# Altium footprint library AltiumLibrary.PcbLib: 107 footprints (part 5 of 7)
Each footprint in its own frame and in the unit in brackets; x right, y up, seen from the top. Pads: shape width x height; smd on the part's side, far side on the other; paste and mask are expansions set on the pad; w line width, h text height; cw(c..) or ccw(c..) is an arc to the next point about the centre after c.
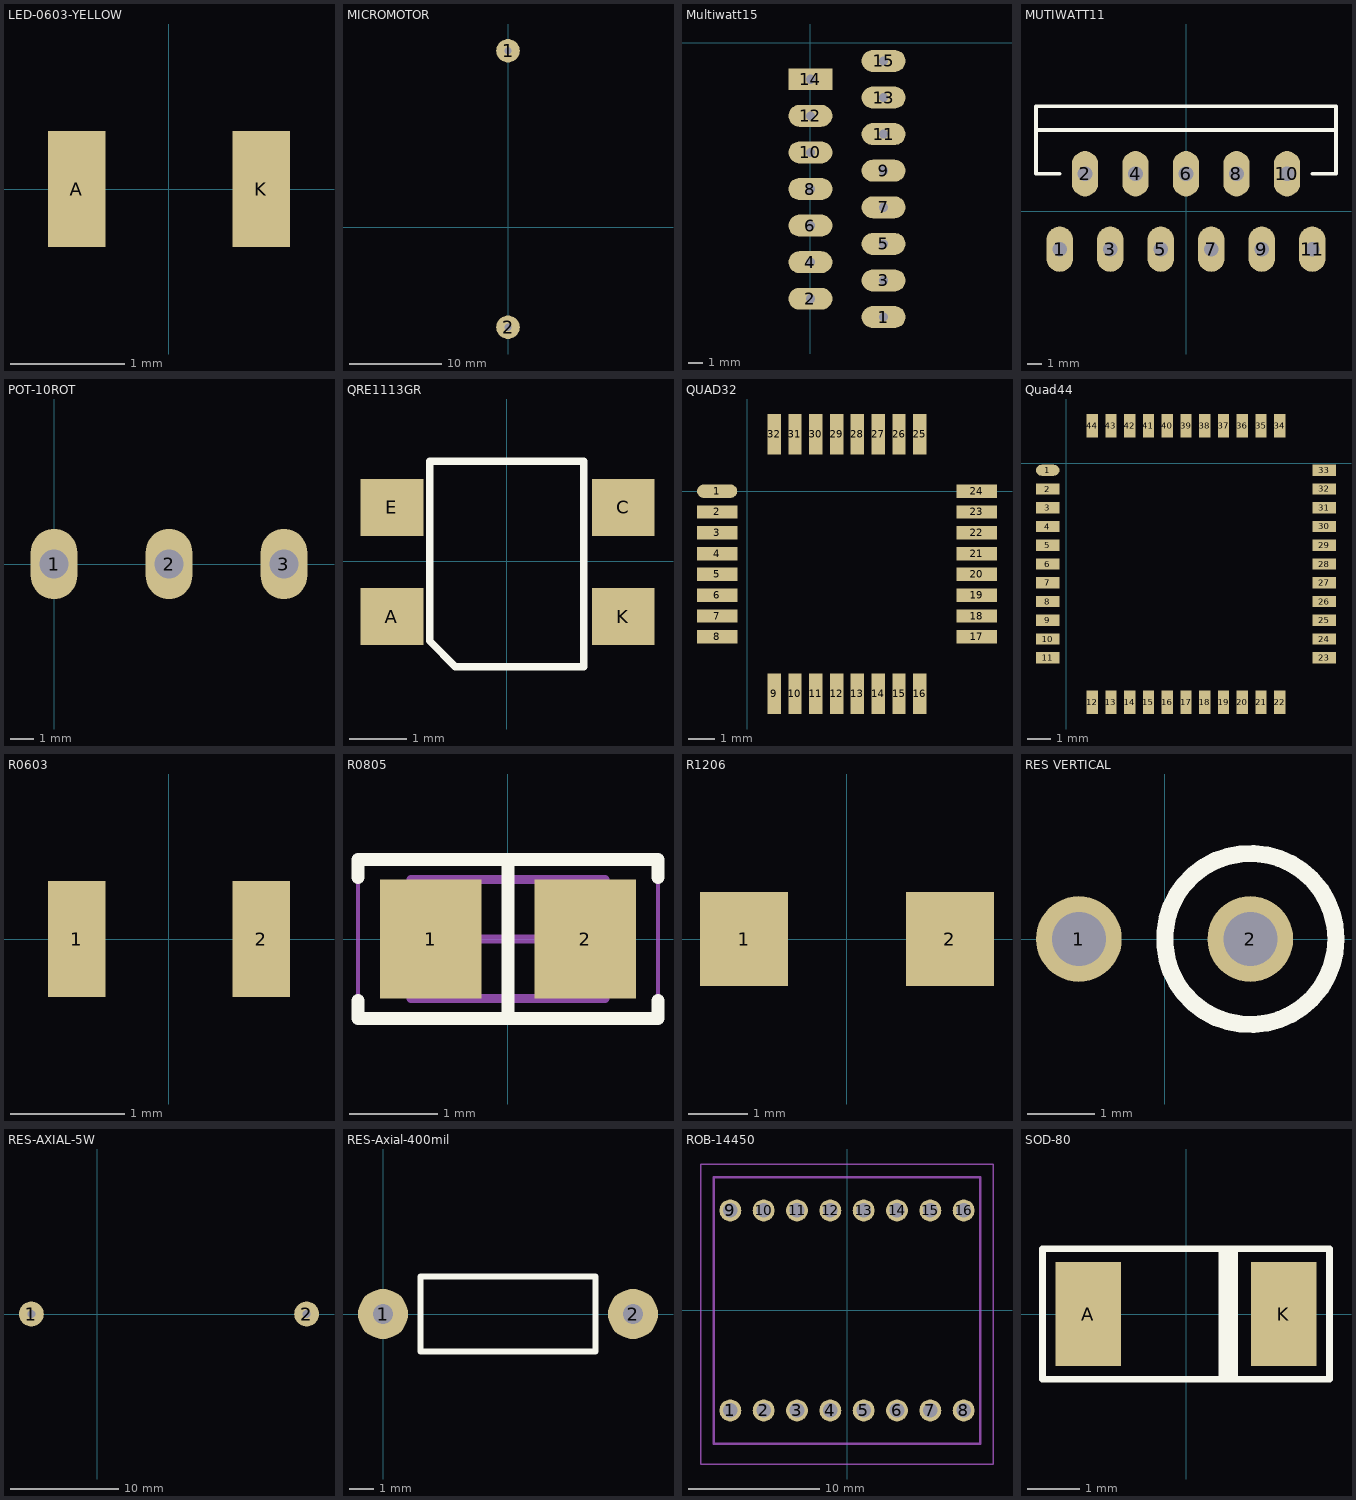
[diagram p4: the footprints below, top view; thin cyan lines are the x and y axes]

## LED-0603-YELLOW [mil]
pads (2):
  rect 20x40 smd: A(-31.89,0) K(31.89,0)
3D body "User Library-led0603_YEL.step": height 43.31, standoff 0, extent -31.89,-15.74 31.89,15.75

## MICROMOTOR [mm]
pads (2):
  round 2.54 hole 0.8: 1(0,19.05) 2(0,-10.795)
3D body "User Library-MOTOR, POLOLU.step": height 9.95, standoff -0.05, extent -0.762,-2.094 34.008,9.906
3D body "User Library-Pololu Extended Micro Metal Bracket.step": height 11.5, standoff 0, extent 7.366,-9.525 24.666,17.075

## Multiwatt15 [mil]
pads (15):
  oval 120x60 hole 25: 1(200,-750) 2(0,-700) 3(200,-650) 4(0,-600) 5(200,-550) 6(0,-500) 7(200,-450) 8(0,-400) 9(200,-350) 10(0,-300) 11(200,-250) 12(0,-200) 13(200,-150) 15(200,-50)
  rect 120x60 hole 25: 14(0,-100)
3D body "User Library-Multiwatt15V.STEP": height 831.1, standoff -46.85, extent -175,-785.83 214.37,-14.17

## MUTIWATT11 [mil]
pads (11):
  oval 70x120 hole 39.37: 1(-334.65,-100) 2(-267.72,100) 3(-200.79,-100) 4(-133.86,100) 5(-66.93,-100) 6(0,100) 7(66.93,-100) 8(133.86,100) 9(200.79,-100) 10(267.72,100) 11(334.65,-100)
Top Overlay:
  lines w10: -397.64,216.14 397.64,216.14 ; -334.65,100 -397.64,100 -397.64,279.13 397.64,279.13 397.64,100 334.65,100
3D body "User Library-Multiwatt11V.step": height 858.27, standoff -125.98, extent -397.64,-113.78 397.64,275.59

## POT-10ROT [mil]
pads (3):
  oval 80x120 hole 49.21: 1(0,0) 2(196.85,0) 3(393.7,0)
3D body "B10K potentiometer 10K.stp": height 828.74, standoff -137.8, extent -137.59,-780.71 535.6,203.54

## QRE1113GR [mm]
pads (4):
  rect 1.1x1 smd: A(-2.01,-0.97) C(2.04,0.94) E(-2.01,0.94) K(2.04,-0.97)
Top Overlay:
  lines w0.127: -1.35,-1.4 -1.35,1.75 1.35,1.75 1.35,-1.85 -0.9,-1.85 -1.35,-1.4
Top Paste:
  region: -2.601,1.5 -1.4,1.5 -1.4,0.4 -2.601,0.4
  region: -2.605,-0.4 -1.4,-0.4 -1.4,-1.503 -2.605,-1.503
  region: 1.453,-0.4 2.65,-0.4 2.65,-1.503 1.453,-1.503
  region: 1.404,1.5 2.65,1.5 2.65,0.401 1.404,0.401
3D body "User Library-QRE1113GR.step": height 1.83, standoff -0.02, extent -2.4,-1.8 2.4,1.8

## QUAD32 [mil]
pads (32):
  oval 60x20 smd: 1(-45,0)
  rect 60x20 smd: 2(-45,-31) 3(-45,-62) 4(-45,-93) 5(-45,-124) 6(-45,-155) 7(-45,-186) 8(-45,-217) 17(342,-217) 18(342,-186) 19(342,-155) 20(342,-124) 21(342,-93) 22(342,-62) 23(342,-31) 24(342,0)
  rect 20x60 smd: 9(40,-302) 10(71,-302) 11(102,-302) 12(133,-302) 13(164,-302) 14(195,-302) 15(226,-302) 16(257,-302) 25(257,85) 26(226,85) 27(195,85) 28(164,85) 29(133,85) 30(102,85) 31(71,85) 32(40,85)
3D body "User Library-PTQFPK32.step": height 68, standoff 5, extent -32,-289 328,71

## Quad44 [mm]
pads (44):
  oval 1x0.47 smd: 1(-0.8,-0.3)
  rect 1x0.47 smd: 2(-0.8,-1.1) 3(-0.8,-1.9) 4(-0.8,-2.7) 5(-0.8,-3.5) 6(-0.8,-4.3) 7(-0.8,-5.1) 8(-0.8,-5.9) 9(-0.8,-6.7) 10(-0.8,-7.5) 11(-0.8,-8.3) 23(11,-8.3) 24(11,-7.5) 25(11,-6.7) 26(11,-5.9) 27(11,-5.1) 28(11,-4.3) 29(11,-3.5) 30(11,-2.7) 31(11,-1.9) 32(11,-1.1) 33(11,-0.3)
  rect 0.47x1 smd: 12(1.1,-10.2) 13(1.9,-10.2) 14(2.7,-10.2) 15(3.5,-10.2) 16(4.3,-10.2) 17(5.1,-10.2) 18(5.9,-10.2) 19(6.7,-10.2) 20(7.5,-10.2) 21(8.3,-10.2) 22(9.1,-10.2) 34(9.1,1.6) 35(8.3,1.6) 36(7.5,1.6) 37(6.7,1.6) 38(5.9,1.6) 39(5.1,1.6) 40(4.3,1.6) 41(3.5,1.6) 42(2.7,1.6) 43(1.9,1.6) 44(1.1,1.6)
3D body "User Library-44 pin tqfp ic package.step": height 1.2, standoff 0.09, extent -0.9,-10.3 11.1,1.7

## R0603 [mil]
pads (2):
  rect 20x40 smd: 1(-31.89,0) 2(31.89,0)
3D body "User Library-0603 SMD Resistor.step": height 11.89, standoff 0, extent -31.49,-15.74 31.5,15.75

## R0805 [mm] "Chip"
height 0.7
pads (2):
  rect 1.15x1.35 smd: 1(-0.875,0) 2(0.875,0)
Top Overlay:
  lines w0.15: -1.7,-0.7 -1.7,-0.9 1.7,-0.9 1.7,-0.7 ; -1.7,0.7 -1.7,0.9 1.7,0.9 1.7,0.7 ; 0,-0.9 0,0.9
Mechanical 13:
  lines w0.1: -1.1,-0.675 -1.1,0.675 1.1,0.675 1.1,-0.675 -1.1,-0.675
Mechanical 15:
  lines w0.05: -1.7,-0.95 -1.7,0.95 1.7,0.95 1.7,-0.95 -1.7,-0.95
  lines w0.1: -0.5,0 0.5,0 ; 0,-0.5 0,0.5
3D body "0805 resistor.STEP": height 0.6, standoff 0, extent -0.95,-0.625 1.05,0.625

## R1206 [mm]
pads (2):
  rect 1.5x1.6 smd: 1(-1.75,0) 2(1.75,0)
3D body "User Library-SMD RESISTOR-1.step": height 0.68, standoff 0.08, extent -1.6,-0.762 1.6,0.838

## RES VERTICAL [mm]
pads (2):
  round 1.27 hole 0.8: 1(-1.27,0) 2(1.27,0)
Top Overlay:
  circle w0.254: c1.27,0 r1.27
3D body "User Library-Res_Stand.step": height 6.79, standoff -1.96, extent -1.52,-0.921 2.192,0.92

## RES-AXIAL-5W [mil]
pads (2):
  round 90 hole 30: 1(-240,0) 2(760,0)
3D body "User Library-Resistor 5W Length 22mm, pitch 1in.step": height 357.17, standoff -211.32, extent -255.74,-187 775.75,187.01

## RES-Axial-400mil [mil]
pads (2):
  round 80 hole 31.5: 1(0,0) 2(400,0)
Top Overlay:
  lines w10: 60,-60 340,-60 340,60 60,60 60,0 60,-60
3D body "SW3dPS-resistor - fixed.STEP": height 94, standoff -110, extent -12,-44 410,44

## ROB-14450 [mm]
pads (16):
  round 1.665 hole 1.11: 1(-8.89,-7.62) 2(-6.35,-7.62) 3(-3.81,-7.62) 4(-1.27,-7.62) 5(1.27,-7.62) 6(3.81,-7.62) 7(6.35,-7.62) 8(8.89,-7.62) 9(-8.89,7.62) 10(-6.35,7.62) 11(-3.81,7.62) 12(-1.27,7.62) 13(1.27,7.62) 14(3.81,7.62) 15(6.35,7.62) 16(8.89,7.62)
Mechanical 1:
  lines w0.2: -10.16,-10.16 -10.16,10.16 10.16,10.16 10.16,-10.16 -10.16,-10.16
Mechanical 20:
  lines w0.1: -11.16,-11.7 -11.16,11.16 11.16,11.16 11.16,-11.7 -11.16,-11.7
3D body "User Library-Motor Driver.STEP": height 6.08, standoff 2.51, extent -10.541,-10.477 10.439,10.427

## SOD-80 [mm]
pads (2):
  rect 1.25x2 smd: A(-1.875,0) K(1.875,0)
Top Overlay:
  rectangle: 0.625,-1.25 1,1.25
  lines w0.127: -2.75,-1.25 2.75,-1.25 2.75,1.25 -2.75,1.25 -2.75,-1.25
3D body "User Library-SOD80-3.STEP": height 1.5, standoff 0, extent -1.8,-0.75 1.8,0.75